# Altium footprint library NFC-Reader.PcbLib: 67 footprints (part 5 of 5)
Each footprint in its own frame and in the unit in brackets; x right, y up, seen from the top. Pads: shape width x height; smd on the part's side, far side on the other; paste and mask are expansions set on the pad; w line width, h text height; cw(c..) or ccw(c..) is an arc to the next point about the centre after c.
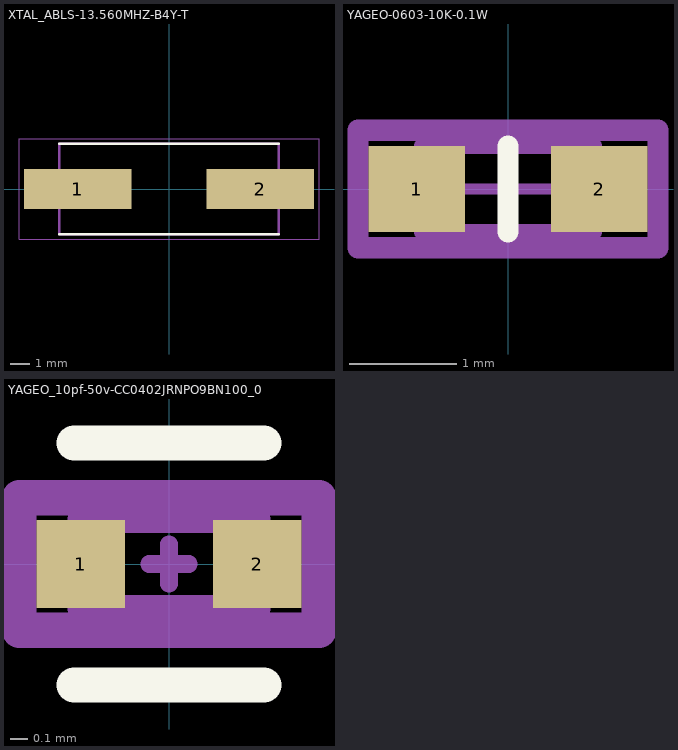
[diagram p4: the footprints below, top view; thin cyan lines are the x and y axes]

## XTAL_ABLS-13.560MHZ-B4Y-T [mm]
height 4.2
pads (2):
  rect 5.6x2.1 smd: 1(-4.75,0) 2(4.75,0)
Top Overlay:
  lines w0.127: -5.7,-2.35 5.7,-2.35 ; -5.7,2.35 5.7,2.35
Top 3D Body:
  lines w0.127: -5.7,-2.35 -5.7,2.35 5.7,2.35 5.7,-2.35 -5.7,-2.35
Top Courtyard:
  lines w0.05: -7.8,-2.6 -7.8,2.6 7.8,2.6 7.8,-2.6 -7.8,-2.6
3D body "step_temp.STEP": height 4.2, standoff 0, extent -6.35,-2.35 6.35,2.35

## YAGEO-0603-10K-0.1W [mm]
pads (2):
  rect 0.9x0.8 smd paste+0 mask+0: 1(-0.85,0) 2(0.85,0)
Top Overlay:
  lines w0.2: 0,-0.4 0,0.4
Mechanical 10:
  lines w0.2: -1.4,-0.55 -1.4,0.55 1.4,0.55 1.4,-0.55 -1.4,-0.55
  text ".Designator" at 0,0 h1
Mechanical 12:
  lines w0.15: -0.8,-0.4 -0.8,0.4 0.8,0.4 0.8,-0.4 -0.8,-0.4
Top Courtyard:
  lines w0.1: -0.5,0 0.5,0 ; 0,-0.5 0,0.5
  lines w0.2: -1.4,-0.55 -1.4,0.55 1.4,0.55 1.4,-0.55 -1.4,-0.55
3D body "3dmodel.step": height 0.25, standoff 0, extent -1.4,-0.55 1.4,0.55

## YAGEO_10pf-50v-CC0402JRNPO9BN100_0 [mm]
pads (2):
  rect 0.5x0.5 smd paste+0 mask+0: 1(-0.5,0) 2(0.5,0)
Top Overlay:
  lines w0.2: -0.536,-0.686 0.536,-0.686 ; -0.536,0.686 0.536,0.686
Mechanical 10:
  lines w0.2: -0.85,-0.375 0.85,-0.375 0.85,0.375 -0.85,0.375 -0.85,-0.375
  text ".Designator" at 0,0 h1
Mechanical 12:
  lines w0.15: -0.5,-0.25 0.5,-0.25 0.5,0.25 -0.5,0.25 -0.5,-0.25
Top Courtyard:
  lines w0.1: -0.112,0 0.112,0 ; 0,-0.112 0,0.112
  lines w0.2: -0.85,-0.375 0.85,-0.375 0.85,0.375 -0.85,0.375 -0.85,-0.375
3D body "3dmodel.step": height 0.25, standoff 0, extent -0.85,-0.375 0.85,0.375